# Altium footprint library ESKDPcbLib.PcbLib: 608 footprints (part 14 of 38)
Each footprint in its own frame and in the unit in brackets; x right, y up, seen from the top. Pads: shape width x height; smd on the part's side, far side on the other; paste and mask are expansions set on the pad; w line width, h text height; cw(c..) or ccw(c..) is an arc to the next point about the centre after c.
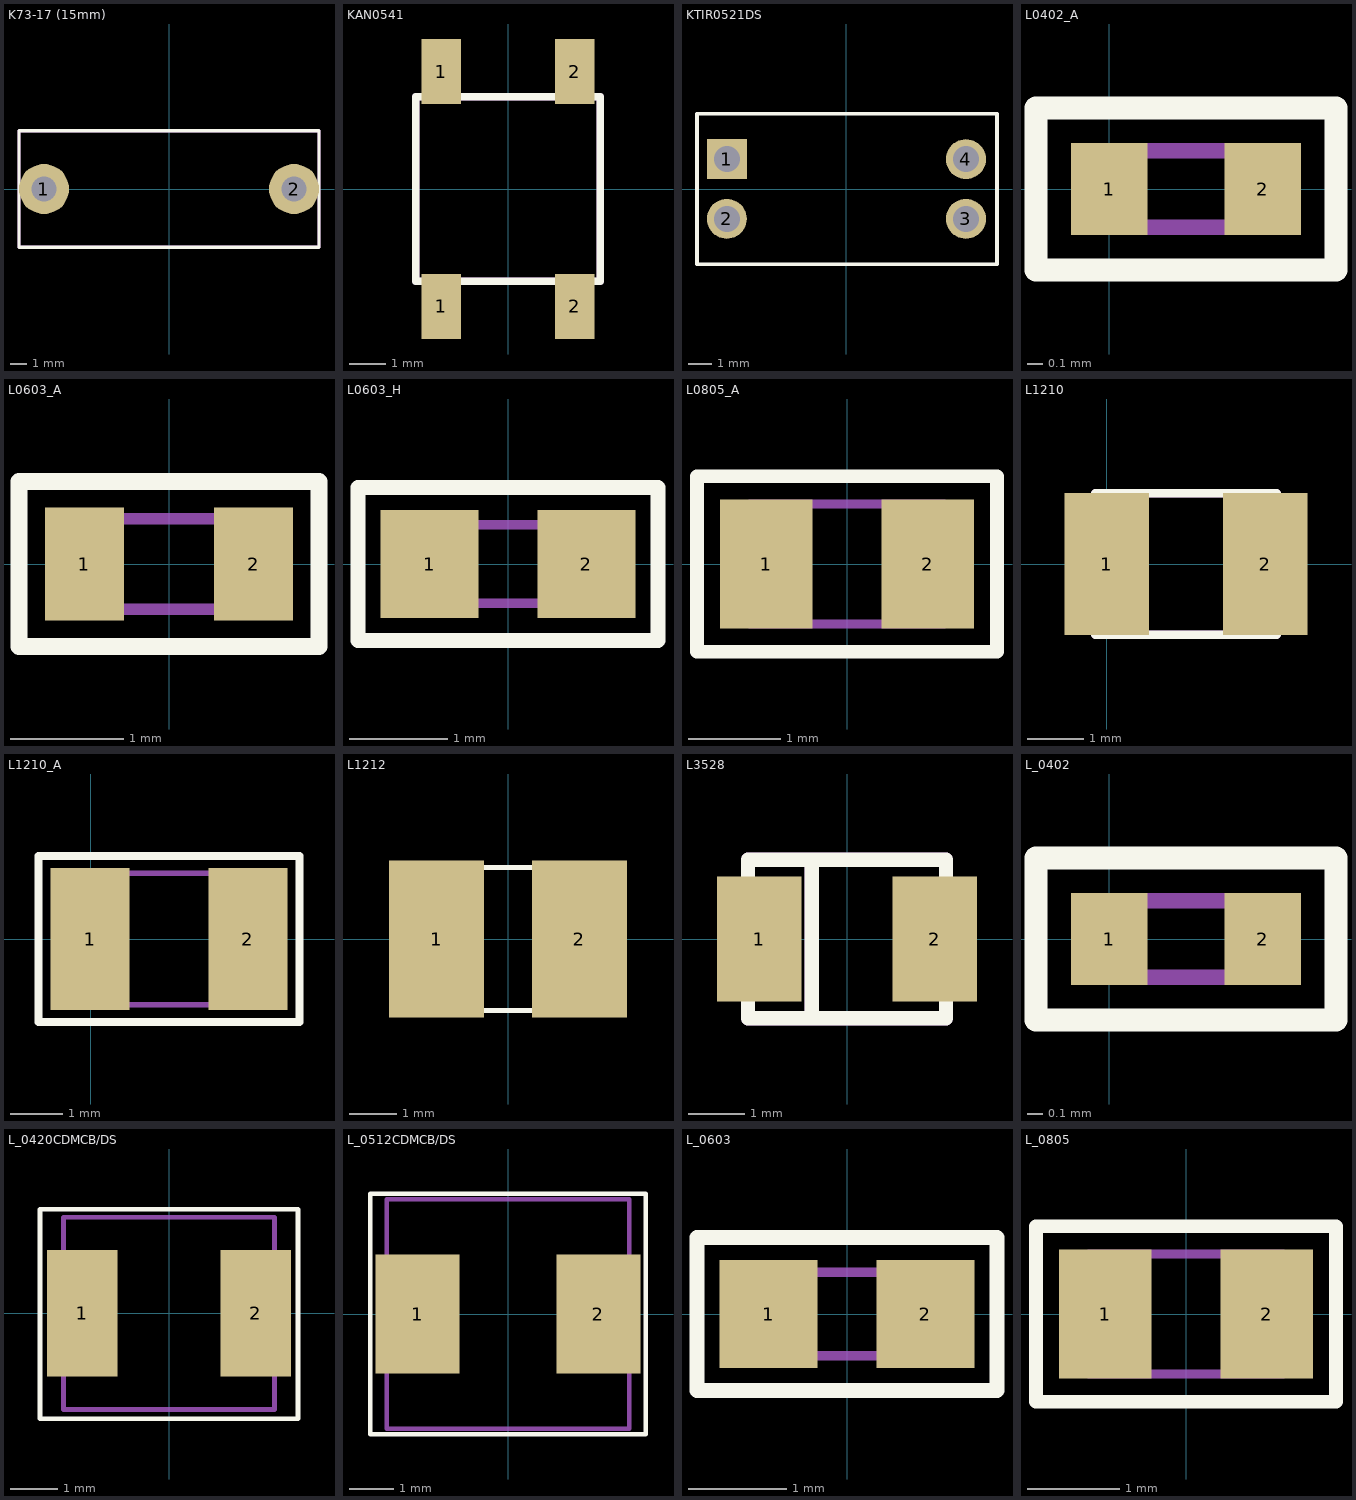
[diagram p13: the footprints below, top view; thin cyan lines are the x and y axes]

## K73-17 (15mm) [mm]
pads (2):
  round 3 hole 1.5: 1(-7.5,0) 2(7.5,0)
Top Overlay:
  lines w0.2: -9,-3.5 9,-3.5 9,3.5 -9,3.5 -9,-3.5
Mechanical 7:
  lines w0.2: -9,-3.5 -9,3.5 9,3.5 9,-3.5 -9,-3.5
Mechanical 10:
  text ".Comment" at 3,4 h0.6
  text ".Designator" at 3,4.5 h0.8
3D body: height 12, standoff 0, extent -9,-3.5 9,3.5

## KAN0541 [mm]
pads (4):
  rect 1.1x1.8 smd: 1(-1.85,-3.25) 1(-1.85,3.25) 2(1.85,-3.25) 2(1.85,3.25)
Top Overlay:
  lines w0.2: -2.55,-2.55 2.55,-2.55 2.55,2.55 -2.55,2.55 -2.55,-2.55
Mechanical 7:
  lines w0.2: -2.55,-2.55 2.55,-2.55 2.55,2.55 -2.55,2.55 -2.55,-2.55
3D body "IT-1187.STEP": height 1.5, standoff 0, extent -2.6,-3.2 2.6,3.2

## KTIR0521DS [mm]
pads (4):
  rect 1.7x1.7 hole 1.1: 1(-5.08,1.27)
  round 1.7 hole 1.1: 2(-5.08,-1.27) 3(5.08,-1.27) 4(5.08,1.27)
Top Overlay:
  lines w0.15: -6.35,-3.2 -6.35,3.2 6.4,3.2 6.4,-3.2 -6.35,-3.2
Mechanical 7:
  lines w0.1: -6.35,-3.2 -6.35,3.2 6.4,3.2 6.4,-3.2 -6.35,-3.2
3D body: height 7.1, standoff -4.4, extent -6.4,-3.2 6.4,3.2

## L0402_A [mm]
pads (2):
  rect 0.5x0.6 smd: 1(0,0) 2(1,0)
Top Overlay:
  lines w0.15: -0.48,-0.53 -0.48,0.53 1.48,0.53 1.48,-0.53 -0.48,-0.53
Mechanical 7:
  lines w0.1: 0,-0.25 1,-0.25 1,0.25 0,0.25 0,-0.25
Mechanical 10:
  text ".Designator" at -0.08,0.75 h0.8
  text ".Comment" at -0.08,-1.11 h0.6
3D body: height 0.35, standoff 0, extent 0,-0.25 1,0.25

## L0603_A [mm]
height 0.8
pads (2):
  rect 0.7x1 smd: 1(-0.75,0) 2(0.75,0)
Top Overlay:
  lines w0.15: -1.33,-0.73 1.33,-0.73 1.33,0.73 -1.33,0.73 -1.33,-0.73
Mechanical 7:
  lines w0.1: -0.8,-0.4 -0.8,0.4 0.8,0.4 0.8,-0.4 -0.8,-0.4
Mechanical 10:
  text ".Designator" at -0.62,1 h0.8
  text ".Comment" at -0.75,-1.28 h0.6
3D body: height 0.8, standoff 0, extent -0.8,-0.4 0.8,0.4

## L0603_H [mm]
height 0.8
pads (2):
  rect 1x1.1 smd: 1(-0.8,0) 2(0.8,0)
Top Overlay:
  lines w0.15: -1.53,-0.78 -1.53,0.78 1.53,0.78 1.53,-0.78 -1.53,-0.78
Mechanical 7:
  lines w0.1: -0.8,-0.4 0.8,-0.4 0.8,0.4 -0.8,0.4 -0.8,-0.4
Mechanical 10:
  text ".Designator" at -0.62,1 h0.8
  text ".Comment" at -0.61,-1.33 h0.6
3D body: height 0.8, standoff 0, extent -0.8,-0.4 0.8,0.4

## L0805_A [mm]
height 1.4
pads (2):
  rect 1x1.4 smd: 1(-0.875,0) 2(0.875,0)
Top Overlay:
  lines w0.15: -1.625,-0.95 -1.625,0.95 1.625,0.95 1.625,-0.95 -1.625,-0.95
Mechanical 7:
  lines w0.1: -1.05,-0.65 -1.05,0.65 1.05,0.65 1.05,-0.65 -1.05,-0.65
Mechanical 10:
  text ".Designator" at -1.525,1.375 h0.8
  text ".Comment" at -1.125,-1.625 h0.6
3D body: height 1.4, standoff 0, extent -1.05,-0.65 1.05,0.65

## L1210 [mm]
pads (2):
  rect 1.5x2.5 smd: 1(0,0) 2(2.8,0)
Top Overlay:
  lines w0.15: -0.2,-1.25 3,-1.25 3,1.25 -0.2,1.25 -0.2,-1.25
Mechanical 7:
  lines w0.15: -0.2,-1.25 -0.2,1.25 3,1.25 3,-1.25 -0.2,-1.25
Mechanical 10:
  text ".Designator" at -0.4,1.5 h1
  text ".Comment" at -0.527,2.281 h1
3D body: height 1.95, standoff -0.05, extent -0.191,-1.238 3.009,1.262

## L1210_A [mm]
pads (2):
  rect 1.5x2.7 smd: 1(-0.01,0) 2(2.99,0)
Top Overlay:
  lines w0.15: -0.99,-1.58 3.97,-1.58 3.97,1.58 -0.99,1.58 -0.99,-1.58
Mechanical 7:
  lines w0.1: -0.11,-1.25 -0.11,1.25 3.09,1.25 3.09,-1.25 -0.11,-1.25
Mechanical 10:
  text ".Comment" at 0.75,-2.23 h0.6
  text ".Designator" at 0.78,1.89 h0.8
3D body: height 2.5, standoff 0, extent -0.11,-1.25 3.09,1.25

## L1212 [mm]
pads (2):
  rect 2x3.3 smd: 1(-1.5,0) 2(1.5,0)
Top Overlay:
  lines w0.1: -1.5,-1.5 1.5,-1.5 1.5,1.5 -1.5,1.5 -1.5,-1.5
Mechanical 7:
  lines w0.1: -1.5,-1.5 1.5,-1.5 1.5,1.5 -1.5,1.5 -1.5,-1.5
Mechanical 10:
  text ".Designator" at -1,2.9 h1
  text ".Comment" at -1,3.8 h1

## L3528 [mm]
pads (2):
  rect 1.5x2.2 smd: 1(-1.55,0) 2(1.55,0)
Top Overlay:
  lines w0.254: -0.625,-1.4 -0.625,1.4 ; -1.75,-1.4 1.75,-1.4 1.75,1.4 -1.75,1.4 -1.75,-1.4
Mechanical 7:
  lines w0.254: -0.625,-1.4 -0.625,1.4 ; -1.75,-1.4 1.75,-1.4 1.75,1.4 -1.75,1.4 -1.75,-1.4
Mechanical 10:
  text ".Designator" at -2.25,2.75 h1.5
  text ".Comment" at -2.25,3.75 h1.5
3D body "3528.STEP": height 1.9, standoff 0, extent -1.75,-1.4 1.75,1.4

## L_0402 [mm]
pads (2):
  rect 0.5x0.6 smd: 1(0,0) 2(1,0)
Top Overlay:
  lines w0.15: -0.48,-0.53 1.48,-0.53 1.48,0.53 -0.48,0.53 -0.48,-0.53
Mechanical 7:
  lines w0.1: 0,-0.25 0,0.25 1,0.25 1,-0.25 0,-0.25
Mechanical 10:
  text ".Comment" at -0.08,-1.11 h0.6
  text ".Designator" at -0.08,0.75 h0.8
3D body: height 0.35, standoff 0, extent 0,-0.25 1,0.25

## L_0420CDMCB/DS [mm] "SMD Power Inductor SUMIDA"
height 1.2
pads (2):
  rect 1.5x2.7 smd mask+0: 1(-1.85,0) 2(1.85,0)
Top Overlay:
  lines w0.1: -2.75,-2.25 -2.75,2.225 2.75,2.225 2.75,-2.25 -2.75,-2.25
Mechanical 7:
  lines w0.1: -2.25,-2.05 2.25,-2.05 2.25,2.05 -2.25,2.05 -2.25,-2.05
Mechanical 10:
  text ".Comment" at -1.15,-2.8 h0.6
  text ".Designator" at -1.8,2.5 h0.8
3D body: height 1.2, standoff 0.05, extent -2.25,-2.05 2.25,2.05

## L_0512CDMCB/DS [mm] "SMD Power Inductor SUMIDA"
height 1.2
pads (2):
  rect 1.9x2.7 smd mask+0: 1(-2.05,0) 2(2.05,0)
Top Overlay:
  lines w0.1: -3.125,-2.725 3.125,-2.725 3.125,2.725 -3.125,2.725 -3.125,-2.725
Mechanical 7:
  lines w0.1: -2.75,-2.6 -2.75,2.6 2.75,2.6 2.75,-2.6 -2.75,-2.6
Mechanical 10:
  text ".Designator" at -1.775,3 h0.8
  text ".Comment" at -1.1,-3.275 h0.6
3D body: height 1.2, standoff 0.05, extent -2.75,-2.6 2.75,2.6

## L_0603 [mm]
height 0.45
pads (2):
  rect 1x1.1 smd: 1(-0.8,0) 2(0.8,0)
Top Overlay:
  lines w0.15: -1.53,-0.78 -1.53,0.78 1.53,0.78 1.53,-0.78 -1.53,-0.78
Mechanical 7:
  lines w0.1: -0.8,-0.425 0.8,-0.425 0.8,0.425 -0.8,0.425 -0.8,-0.425
Mechanical 10:
  text ".Designator" at -0.62,1 h0.8
  text ".Comment" at -0.78,-1.36 h0.6
3D body: height 0.45, standoff 0, extent -0.8,-0.425 0.8,0.425

## L_0805 [mm]
height 1.4
pads (2):
  rect 1x1.4 smd: 1(-0.875,0) 2(0.875,0)
Top Overlay:
  lines w0.15: -1.625,-0.95 -1.625,0.95 1.625,0.95 1.625,-0.95 -1.625,-0.95
Mechanical 7:
  lines w0.1: -1.05,-0.65 -1.05,0.65 1.05,0.65 1.05,-0.65 -1.05,-0.65
Mechanical 10:
  text ".Designator" at -1.525,1.375 h0.8
  text ".Comment" at -1.125,-1.625 h0.6
3D body: height 1.4, standoff 0, extent -1.05,-0.65 1.05,0.65